# Altium footprint library mobinbyn-Socket.PcbLib: 131 footprints (part 2 of 9)
Each footprint in its own frame and in the unit in brackets; x right, y up, seen from the top. Pads: shape width x height; smd on the part's side, far side on the other; paste and mask are expansions set on the pad; w line width, h text height; cw(c..) or ccw(c..) is an arc to the next point about the centre after c.
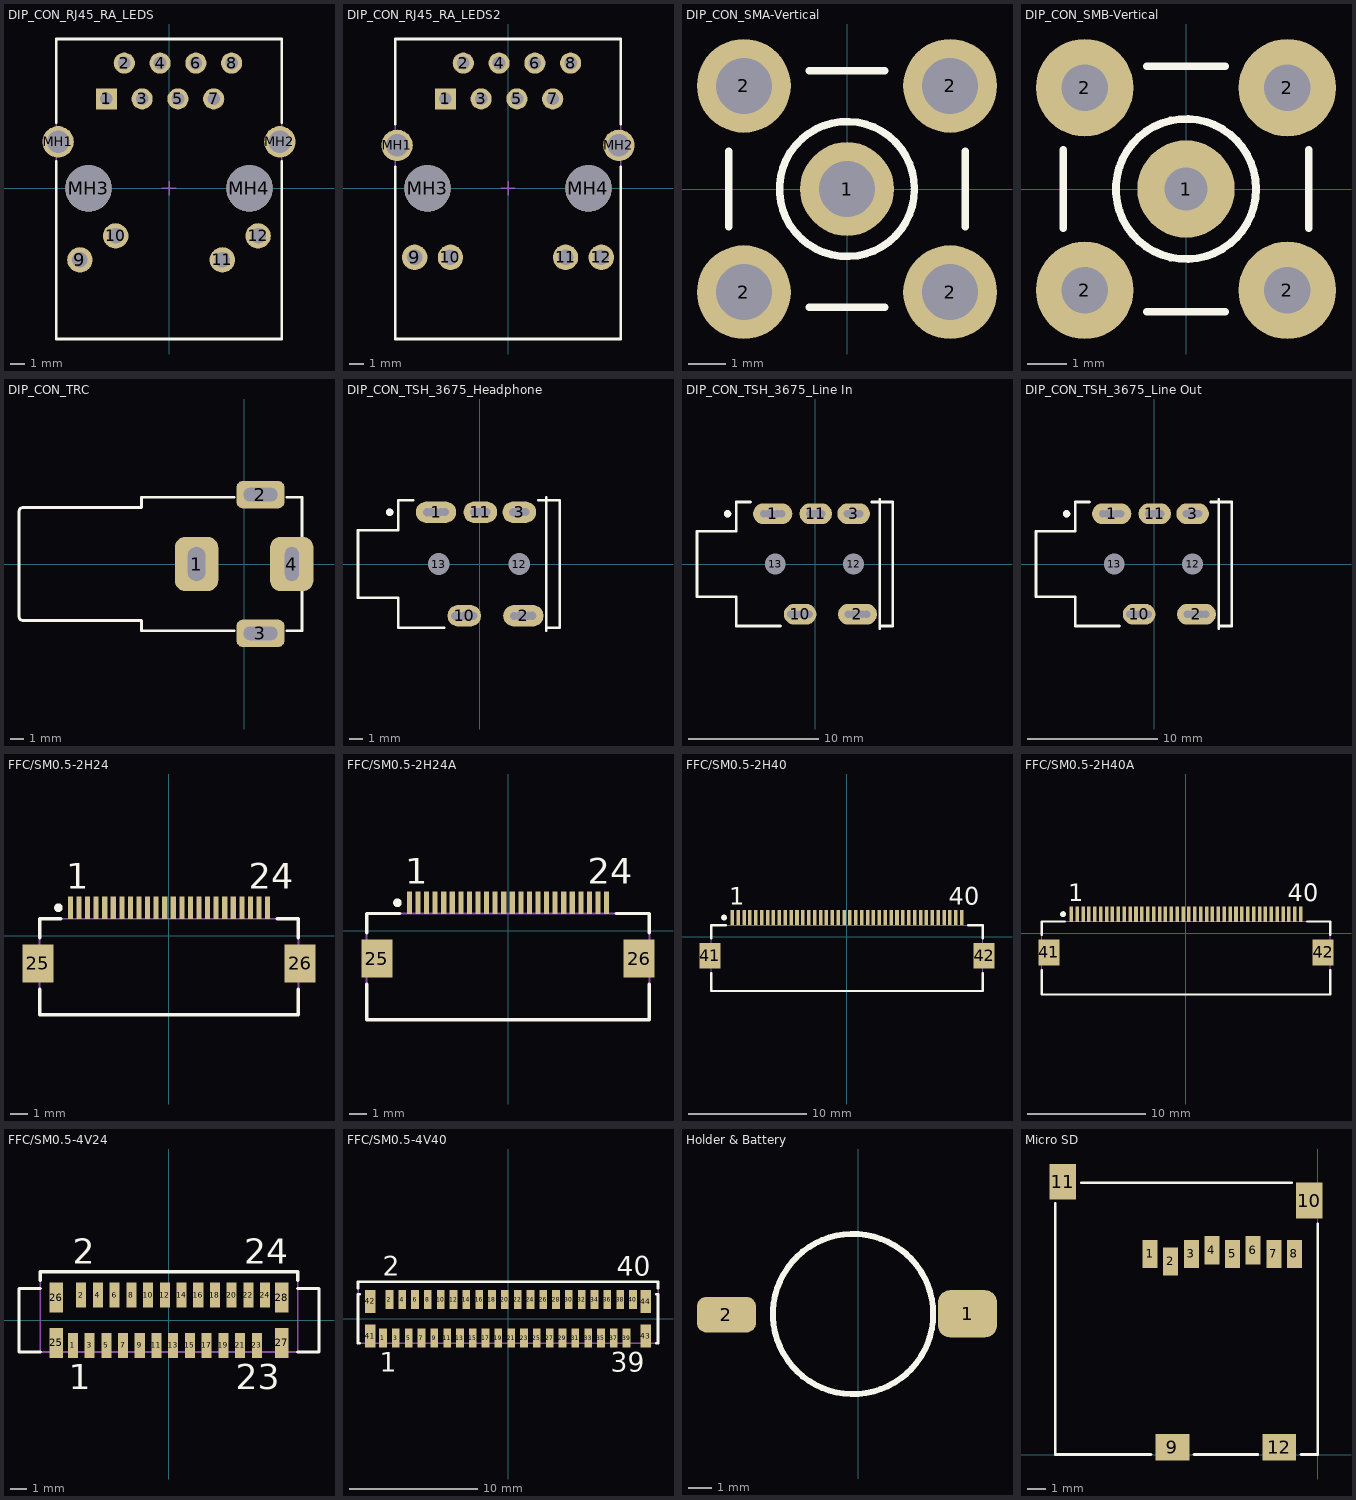
[diagram p1: the footprints below, top view; thin cyan lines are the x and y axes]

## DIP_CON_RJ45_RA_LEDS [mm] "RJ45 Ethernet Connector With LEDs"
height 13.2
pads (16):
  rect 1.5x1.5 hole 0.9: 1(-4.445,6.35)
  round 1.5 hole 0.9: 2(-3.175,8.89) 3(-1.905,6.35) 4(-0.635,8.89) 5(0.635,6.35) 6(1.905,8.89) 7(3.175,6.35) 8(4.445,8.89)
  round 1.8 hole 1.1: 9(-6.325,-5.08) 10(-3.785,-3.38) 11(3.785,-5.08) 12(6.325,-3.38)
  round 2.23 hole 1.6: MH1(-7.875,3.3) MH2(7.875,3.3)
  round 3.3 hole 3.3 unplated: MH3(-5.715,0) MH4(5.715,0)
Top Overlay:
  lines w0.2: -8,1.905 -8,-10.7 8,-10.7 8,1.905 ; -8,4.665 -8,10.6 8,10.6 8,4.665
Mechanical 13:
  lines w0.1: -8,-10.7 8,-10.7 8,10.6 -8,10.6 -8,-10.7
Mechanical 15:
  lines w0.1: -0.5,0 0.5,0 ; 0,-0.5 0,0.5
3D body "RJ45cat5step.stp": height 24.61, standoff -2.07, extent -6.043,-145.273 5.637,2.095
3D body "alteredRJstep.STEP": height 13.14, standoff -3.9, extent -7.897,-10.71 7.968,10.601

## DIP_CON_RJ45_RA_LEDS2 [mm] "HR911105A Connector"
height 13.2
pads (16):
  rect 1.5x1.5 hole 0.9: 1(-4.445,6.35)
  round 1.5 hole 0.9: 2(-3.175,8.89) 3(-1.905,6.35) 4(-0.635,8.89) 5(0.635,6.35) 6(1.905,8.89) 7(3.175,6.35) 8(4.445,8.89)
  round 1.8 hole 1.1: 9(-6.625,-4.9) 10(-4.085,-4.9) 11(4.085,-4.9) 12(6.625,-4.9)
  round 2.23 hole 1.6: MH1(-7.875,3.05) MH2(7.875,3.05)
  round 3.3 hole 3.3 unplated: MH3(-5.715,0) MH4(5.715,0)
Top Overlay:
  lines w0.2: -8,1.524 -8,-10.7 8,-10.7 8,1.524 ; -8,4.572 -8,10.6 8,10.6 8,4.572
Mechanical 13:
  lines w0.1: -8,-10.7 -8,10.6 8,10.6 8,-10.7 -8,-10.7
Mechanical 15:
  lines w0.1: -0.5,0 0.5,0 ; 0,-0.5 0,0.5
3D body "RJ45cat5step.stp": height 24.61, standoff -2.07, extent -6.043,-145.273 5.637,2.095
3D body "alteredRJstep.STEP": height 13.14, standoff -3.9, extent -7.897,-10.71 7.968,10.601

## DIP_CON_SMA-Vertical [mm] "High Frequency SMA Connector"
height 10
pads (5):
  round 2.5 hole 1.5: 1(0,0) 2(-2.75,-2.75) 2(-2.75,2.75) 2(2.75,-2.75) 2(2.75,2.75)
Top Overlay:
  circle w0.2: c0,0 r1.8
  lines w0.2: -3.15,-1 -3.15,1 ; -1,-3.15 1,-3.15 ; -1,3.15 1,3.15 ; 3.15,-1 3.15,1
Mechanical 1:
  circle w0.025: c0,0 r0.2
  circle w0.025: c0,0 r1.05
  circle w0.025: c0,0 r1.8
3D body "SMA.STEP": height 9.77, standoff -3.9, extent -3.25,-3.25 3.25,3.25

## DIP_CON_SMB-Vertical [mm] "High Frequency SMB Connector"
height 8
pads (5):
  round 2.5 hole 1.1: 1(0,0)
  round 2.5 hole 1.2: 2(-2.6,-2.6) 2(-2.6,2.6) 2(2.6,-2.6) 2(2.6,2.6)
Top Overlay:
  circle w0.2: c0,0 r1.8
  lines w0.2: -3.15,-1 -3.15,1 ; -1,-3.15 1,-3.15 ; -1,3.15 1,3.15 ; 3.15,-1 3.15,1
3D body "SMB.STEP": height 7.6, standoff -3, extent -2.985,-2.985 2.985,2.985

## DIP_CON_TRC [mm] "TRC Video Connector"
height 3
pads (4):
  rrect50% 3.2x4 hole 1.3 slot 2.5 at 90 deg: 1(-3.5,0)
  rrect50% 3.556x2.032 hole 1 slot 2.5 at 0 deg: 2(1.2,5.1) 3(1.2,-5.1)
  rrect50% 3.2x4 hole 1 slot 2.5 at 90 deg: 4(3.5,0)
Top Overlay:
  lines w0.2: -0.735,-4.9 -7.55,-4.9 -7.55,-4.15 -16.25,-4.15 cw(c-16.25,-3.85) -16.55,-3.85 -16.55,3.85 cw(c-16.25,3.85) -16.25,4.15 -7.55,4.15 -7.55,4.9 -0.735,4.9 ; 3.135,-4.9 4.25,-4.9 4.25,-1.69 ; 3.135,4.9 4.25,4.9 4.25,1.69
Mechanical 2:
  lines w1: 0.396,5.1 1.896,5.1 ; 0.45,-5.1 1.95,-5.1 ; 3.5,-0.75 3.5,0.75
  lines w1.3: -3.5,-0.6 -3.5,0.6
3D body: height 3, standoff 0, extent -3.561,2.452 -2.017,3.999
3D body "RCA plugcable.stp": height -2.91, standoff -14.11, extent -64.112,-5.639 -11.915,5.54
3D body "RCA Phono Jack.stp": height 13.58, standoff -4.84, extent -16.519,-5.263 3.983,5.519

## DIP_CON_TSH_3675_Headphone [mm] "TSH3675 Connector - Headphone"
height 7
pads (27):
  round 0.508 hole 0.6: 1(-3.935,3.848) 1(-3.617,3.848) 1(-2.882,3.852) 1(-2.565,3.852) 2(2.565,-3.852) 2(2.883,-3.852) 2(3.618,-3.848) 2(3.935,-3.848) 3(2.494,3.848) 3(2.735,3.848) 3(3.165,3.852) 3(3.406,3.852) 10(-1.835,-3.852) 10(-1.518,-3.852) 10(-0.783,-3.848) 10(-0.465,-3.848) 11(-0.406,3.848) 11(-0.165,3.848) 11(0.265,3.852) 11(0.506,3.852)
  oval 3x1.6 hole 0.6: 1(-3.25,3.85) 2(3.25,-3.85)
  oval 2.5x1.6 hole 0.6: 3(2.95,3.85) 10(-1.15,-3.85) 11(0.05,3.85)
  round 1.3 hole 1.6 unplated: 12(2.95,0) 13(-3.05,0)
Top Overlay:
  circle w0.3: c-6.7,3.85 r0.125
  lines w0.2: -4.95,4.75 -6.05,4.75 -6.05,2.5 -9.05,2.5 -9.05,-2.5 -6.05,-2.5 -6.05,-4.75 -2.65,-4.75 ; 4.35,4.75 5.95,4.75 5.95,-4.75 4.95,-4.75
  lines w0.203: 4.951,-4.95 4.951,4.95
Bottom Overlay:
  region: -4.686,2.468 -4.686,-4.54 -4.089,-4.54 -4.089,2.468
  region: -3.632,2.925 -3.632,2.747 -2.868,2.747 -2.868,2.925
  region: -0.332,2.925 -0.332,2.747 0.432,2.747 0.432,2.925
  region: 2.568,2.925 2.568,2.747 3.332,2.747 3.332,2.925
  region: -0.768,-2.925 -0.768,-2.747 -1.532,-2.747 -1.532,-2.925
  region: 3.632,-2.925 3.632,-2.747 2.868,-2.747 2.868,-2.925
  region: -6.981,2.596 -6.981,-2.611 -5.05,-2.611 -5.05,2.596
  region: 12.329,0.402 12.309,0.629 11.247,0.536 11.267,0.309
  region: 11.267,-0.41 11.247,-0.638 12.309,-0.731 12.329,-0.503
  lines w0.127: 9.836,-1.362 8.399,-1.362 ; 9.836,1.362 8.399,1.362 ; 8.399,-1.362 9.135,-1.093 9.133,-1.362 9.135,-1.631 8.399,-1.362 ; 8.399,1.362 9.135,1.631 9.133,1.362 9.135,1.093 8.399,1.362
  lines w0.152: 11.754,-0.72 ccw(c12.353,-0.042) 11.781,0.658
  lines w0.178: 8.794,-1.47 9.046,-1.47 ; 8.794,-1.254 9.046,-1.254 ; 8.794,1.254 9.046,1.254 ; 8.794,1.47 9.046,1.47
  lines w0.2: -5.05,-4.95 7.205,-4.95 7.205,4.95 -5.05,4.95 -5.05,-4.95
  lines w0.203: -4.342,1.425 -3.25,1.425 -3.25,2.816 ; -3.524,-1.012 -3.092,-1.012 -2.522,-2.149 -1.949,-1.012 2.267,-1.012 2.93,-1.012 3.226,-1.012 ; -2.305,0.944 -1.873,0.944 -1.303,2.081 -0.73,0.944 2.267,0.944 2.93,0.944 ; -1.499,-2.155 -1.181,-1.381 ; -1.181,-2.777 -1.181,-1.381 ; -0.864,-2.155 -1.181,-1.381 ; -0.279,2.087 0.038,1.312 ; 0.038,2.823 0.038,1.312 ; 0.356,2.087 0.038,1.312 ; 2.938,0.952 2.938,1.312 2.938,2.823 ; 3.238,-2.823 3.238,-1.312 3.238,-1.025 ; 11.418,-0.542 ccw(c11.818,-0.229) 12.144,-0.618 ; 11.418,0.44 cw(c11.818,0.127) 12.144,0.517
  text "L" at 3.659,-2.239 h0.86
  text "R" at 3.659,1.774 h0.86
  text "HEADPHONES" at 5.586,-4.318 h1.4
Mechanical 7:
  circle w0.3: c-6.7,3.85 r0.125
  lines w0.1: -4.95,4.75 -6.05,4.75 -6.05,2.5 -9.05,2.5 -9.05,-2.5 -6.05,-2.5 -6.05,-4.75 -2.65,-4.75 ; 4.35,4.75 5.95,4.75 5.95,-4.75 4.95,-4.75
3D body: height 0, standoff -2, extent 2.818,3.33 3.122,4.394
3D body: height 0, standoff -2, extent -0.093,3.308 0.211,4.373
3D body: height 0, standoff -2, extent -1.32,-4.425 -1.016,-3.361
3D body: height 0, standoff -2, extent -3.354,3.205 -3.049,4.496
3D body: height 0, standoff -2, extent 3.126,-4.471 3.431,-3.18
3D body "PCB1.step": height 7.79, standoff -3.56, extent -112.561,-4.506 1.776,4.506
3D body "stereojackblack3-5.STEP": height 5, standoff 0, extent -9.025,-4.725 5.975,4.775

## DIP_CON_TSH_3675_Line In [mm] "TSH3675 Connector - Line In"
height 7
pads (27):
  round 0.508 hole 0.6: 1(-3.935,3.848) 1(-3.617,3.848) 1(-2.882,3.852) 1(-2.565,3.852) 2(2.565,-3.852) 2(2.883,-3.852) 2(3.618,-3.848) 2(3.935,-3.848) 3(2.494,3.848) 3(2.735,3.848) 3(3.165,3.852) 3(3.406,3.852) 10(-1.835,-3.852) 10(-1.518,-3.852) 10(-0.783,-3.848) 10(-0.465,-3.848) 11(-0.406,3.848) 11(-0.165,3.848) 11(0.265,3.852) 11(0.506,3.852)
  oval 3x1.6 hole 0.6: 1(-3.25,3.85) 2(3.25,-3.85)
  oval 2.5x1.6 hole 0.6: 3(2.95,3.85) 10(-1.15,-3.85) 11(0.05,3.85)
  round 1.3 hole 1.6 unplated: 12(2.95,0) 13(-3.05,0)
Top Overlay:
  circle w0.3: c-6.7,3.85 r0.125
  lines w0.2: -4.95,4.75 -6.05,4.75 -6.05,2.5 -9.05,2.5 -9.05,-2.5 -6.05,-2.5 -6.05,-4.75 -2.65,-4.75 ; 4.35,4.75 5.95,4.75 5.95,-4.75 4.95,-4.75
  lines w0.203: 4.951,-4.95 4.951,4.95
Bottom Overlay:
  region: -6.981,2.596 -6.981,-2.611 -5.05,-2.611 -5.05,2.596
  region: 3.632,-2.925 3.632,-2.747 2.868,-2.747 2.868,-2.925
  region: -0.768,-2.925 -0.768,-2.747 -1.532,-2.747 -1.532,-2.925
  region: 2.568,2.925 2.568,2.747 3.332,2.747 3.332,2.925
  region: -0.332,2.925 -0.332,2.747 0.432,2.747 0.432,2.925
  region: -3.632,2.925 -3.632,2.747 -2.868,2.747 -2.868,2.925
  region: -4.686,2.468 -4.686,-4.54 -4.089,-4.54 -4.089,2.468
  lines w0.127: 8.555,-1.362 9.992,-1.362 ; 8.555,1.362 9.992,1.362 ; 9.992,-1.362 9.256,-1.631 9.258,-1.362 9.256,-1.093 9.992,-1.362 ; 9.992,1.362 9.256,1.093 9.258,1.362 9.256,1.631 9.992,1.362
  lines w0.152: 11.49,0.754 cw(c12.369,-0.55) 13.179,0.798 ; 12.055,0.363 cw(c12.344,-0.525) 12.694,0.341
  lines w0.178: 9.346,-1.47 9.597,-1.47 ; 9.346,-1.254 9.597,-1.254 ; 9.346,1.254 9.597,1.254 ; 9.346,1.47 9.597,1.47
  lines w0.2: -5.05,-4.95 -5.05,4.95 7.205,4.95 7.205,-4.95 -5.05,-4.95
  lines w0.203: -4.342,1.425 -3.25,1.425 -3.25,2.816 ; -3.524,-1.012 -3.092,-1.012 -2.522,-2.149 -1.949,-1.012 2.267,-1.012 2.93,-1.012 3.226,-1.012 ; -2.305,0.944 -1.873,0.944 -1.303,2.081 -0.73,0.944 2.267,0.944 2.93,0.944 ; -1.499,-2.155 -1.181,-1.381 ; -1.181,-2.777 -1.181,-1.381 ; -0.864,-2.155 -1.181,-1.381 ; -0.279,2.087 0.038,1.312 ; 0.038,2.823 0.038,1.312 ; 0.356,2.087 0.038,1.312 ; 2.938,0.952 2.938,1.312 2.938,2.823 ; 3.238,-2.823 3.238,-1.312 3.238,-1.025 ; 11.937,-0.296 12.801,-0.296 ; 12.064,-0.652 11.455,-0.042 13.309,-0.042 12.699,-0.652 12.039,-0.652 12.039,-1.16 12.699,-1.16 12.699,-0.703 ; 12.217,-1.109 12.217,-0.55 ; 12.395,-1.109 12.395,-0.652 ; 12.547,-1.109 12.547,-0.703 ; 12.877,-0.245 12.649,-0.474 12.09,-0.474 11.76,-0.144 13.03,-0.144
  text "R" at 3.659,1.774 h0.86
  text "L" at 3.659,-2.239 h0.86
  text "LINE IN" at 4.976,-4.95 h1.52
Mechanical 7:
  circle w0.3: c-6.7,3.85 r0.125
  lines w0.1: -4.95,4.75 -6.05,4.75 -6.05,2.5 -9.05,2.5 -9.05,-2.5 -6.05,-2.5 -6.05,-4.75 -2.65,-4.75 ; 4.35,4.75 5.95,4.75 5.95,-4.75 4.95,-4.75
3D body "stereojackblack3-5.STEP": height 5, standoff 0, extent -9.025,-4.725 5.975,4.775
3D body "PCB1.step": height 7.79, standoff -3.56, extent -112.561,-4.506 1.776,4.506
3D body: height 0, standoff -2, extent 3.126,-4.471 3.431,-3.18
3D body: height 0, standoff -2, extent -3.354,3.205 -3.049,4.496
3D body: height 0, standoff -2, extent -1.32,-4.425 -1.016,-3.361
3D body: height 0, standoff -2, extent -0.093,3.308 0.211,4.373
3D body: height 0, standoff -2, extent 2.818,3.33 3.122,4.394

## DIP_CON_TSH_3675_Line Out [mm] "TSH3675 Connector - Line Out"
height 7
pads (27):
  round 0.508 hole 0.6: 1(-3.935,3.848) 1(-3.617,3.848) 1(-2.882,3.852) 1(-2.565,3.852) 2(2.565,-3.852) 2(2.883,-3.852) 2(3.618,-3.848) 2(3.935,-3.848) 3(2.494,3.848) 3(2.735,3.848) 3(3.165,3.852) 3(3.406,3.852) 10(-1.835,-3.852) 10(-1.518,-3.852) 10(-0.783,-3.848) 10(-0.465,-3.848) 11(-0.406,3.848) 11(-0.165,3.848) 11(0.265,3.852) 11(0.506,3.852)
  oval 3x1.6 hole 0.6: 1(-3.25,3.85) 2(3.25,-3.85)
  oval 2.5x1.6 hole 0.6: 3(2.95,3.85) 10(-1.15,-3.85) 11(0.05,3.85)
  round 1.3 hole 1.6 unplated: 12(2.95,0) 13(-3.05,0)
Top Overlay:
  circle w0.3: c-6.7,3.85 r0.125
  lines w0.2: -4.95,4.75 -6.05,4.75 -6.05,2.5 -9.05,2.5 -9.05,-2.5 -6.05,-2.5 -6.05,-4.75 -2.65,-4.75 ; 4.35,4.75 5.95,4.75 5.95,-4.75 4.95,-4.75
  lines w0.203: 4.951,-4.95 4.951,4.95
Bottom Overlay:
  region: -6.981,2.596 -6.981,-2.611 -5.05,-2.611 -5.05,2.596
  region: 3.632,-2.925 3.632,-2.747 2.868,-2.747 2.868,-2.925
  region: -0.768,-2.925 -0.768,-2.747 -1.532,-2.747 -1.532,-2.925
  region: 2.568,2.925 2.568,2.747 3.332,2.747 3.332,2.925
  region: -0.332,2.925 -0.332,2.747 0.432,2.747 0.432,2.925
  region: -3.632,2.925 -3.632,2.747 -2.868,2.747 -2.868,2.925
  region: -4.686,2.468 -4.686,-4.54 -4.089,-4.54 -4.089,2.468
  lines w0.127: 9.836,-1.362 8.399,-1.362 ; 9.836,1.362 8.399,1.362 ; 8.399,-1.362 9.135,-1.093 9.133,-1.362 9.135,-1.631 8.399,-1.362 ; 8.399,1.362 9.135,1.631 9.133,1.362 9.135,1.093 8.399,1.362
  lines w0.152: 11.49,0.754 cw(c12.369,-0.55) 13.179,0.798 ; 12.055,0.363 cw(c12.344,-0.525) 12.694,0.341
  lines w0.178: 8.794,-1.47 9.046,-1.47 ; 8.794,-1.254 9.046,-1.254 ; 8.794,1.254 9.046,1.254 ; 8.794,1.47 9.046,1.47
  lines w0.2: -5.05,-4.95 -5.05,4.95 7.205,4.95 7.205,-4.95 -5.05,-4.95
  lines w0.203: -4.342,1.425 -3.25,1.425 -3.25,2.816 ; -3.524,-1.012 -3.092,-1.012 -2.522,-2.149 -1.949,-1.012 2.267,-1.012 2.93,-1.012 3.226,-1.012 ; -2.305,0.944 -1.873,0.944 -1.303,2.081 -0.73,0.944 2.267,0.944 2.93,0.944 ; -1.499,-2.155 -1.181,-1.381 ; -1.181,-2.777 -1.181,-1.381 ; -0.864,-2.155 -1.181,-1.381 ; -0.279,2.087 0.038,1.312 ; 0.038,2.823 0.038,1.312 ; 0.356,2.087 0.038,1.312 ; 2.938,0.952 2.938,1.312 2.938,2.823 ; 3.238,-2.823 3.238,-1.312 3.238,-1.025 ; 11.937,-0.296 12.801,-0.296 ; 12.064,-0.652 11.455,-0.042 13.309,-0.042 12.699,-0.652 12.039,-0.652 12.039,-1.16 12.699,-1.16 12.699,-0.703 ; 12.217,-1.109 12.217,-0.55 ; 12.395,-1.109 12.395,-0.652 ; 12.547,-1.109 12.547,-0.703 ; 12.877,-0.245 12.649,-0.474 12.09,-0.474 11.76,-0.144 13.03,-0.144
  text "LINE OUT" at 4.976,-4.95 h1.52
  text "R" at 3.659,1.774 h0.86
  text "L" at 3.659,-2.239 h0.86
Mechanical 7:
  circle w0.3: c-6.7,3.85 r0.125
  lines w0.1: -4.95,4.75 -6.05,4.75 -6.05,2.5 -9.05,2.5 -9.05,-2.5 -6.05,-2.5 -6.05,-4.75 -2.65,-4.75 ; 4.35,4.75 5.95,4.75 5.95,-4.75 4.95,-4.75
3D body "stereojackblack3-5.STEP": height 5, standoff 0, extent -9.025,-4.725 5.975,4.775
3D body "PCB1.step": height 7.79, standoff -3.56, extent -112.561,-4.506 1.776,4.506
3D body: height 0, standoff -2, extent 3.126,-4.471 3.431,-3.18
3D body: height 0, standoff -2, extent -3.354,3.205 -3.049,4.496
3D body: height 0, standoff -2, extent -1.32,-4.425 -1.016,-3.361
3D body: height 0, standoff -2, extent -0.093,3.308 0.211,4.373
3D body: height 0, standoff -2, extent 2.818,3.33 3.122,4.394

## FFC/SM0.5-2H24 [mm] "Connector; FH12 Series; 24 Position; 0.5mm Spaced Bottom Contact"
height 2
pads (26):
  rect 0.3x1.3 smd: 1(-5.75,1.625) 2(-5.25,1.625) 3(-4.75,1.625) 4(-4.25,1.625) 5(-3.75,1.625) 6(-3.25,1.625) 7(-2.75,1.625) 8(-2.25,1.625) 9(-1.75,1.625) 10(-1.25,1.625) 11(-0.75,1.625) 12(-0.25,1.625) 13(0.25,1.625) 14(0.75,1.625) 15(1.25,1.625) 16(1.75,1.625) 17(2.25,1.625) 18(2.75,1.625) 19(3.25,1.625) 20(3.75,1.625) 21(4.25,1.625) 22(4.75,1.625) 23(5.25,1.625) 24(5.75,1.625)
  rect 1.8x2.2 smd: 25(-7.65,-1.625) 26(7.65,-1.625)
Top Overlay:
  circle w0.25: c-6.45,1.625 r0.125
  lines w0.2: -7.55,-3.125 -7.55,-4.625 7.55,-4.625 7.55,-3.125 ; -7.55,-0.125 -7.55,0.975 -6.3,0.975 ; 6.3,0.975 7.55,0.975 7.55,-0.125
  text "24" at 4.65,2.725 h1.5
  text "1" at -6,2.725 h1.5
Mechanical 13:
  lines w0.1: -7.55,-4.625 -7.55,0.975 7.55,0.975 7.55,-4.625 -7.55,-4.625
3D body "5604.stp": height 2, standoff -0.04, extent -9.3,-4.83 9.3,1.97

## FFC/SM0.5-2H24A [mm] "Connector; FH12 Series; 24 Position; 0.5mm Spaced Top Contact"
height 2
pads (26):
  rect 0.3x1.3 smd: 1(-5.75,1.625) 2(-5.25,1.625) 3(-4.75,1.625) 4(-4.25,1.625) 5(-3.75,1.625) 6(-3.25,1.625) 7(-2.75,1.625) 8(-2.25,1.625) 9(-1.75,1.625) 10(-1.25,1.625) 11(-0.75,1.625) 12(-0.25,1.625) 13(0.25,1.625) 14(0.75,1.625) 15(1.25,1.625) 16(1.75,1.625) 17(2.25,1.625) 18(2.75,1.625) 19(3.25,1.625) 20(3.75,1.625) 21(4.25,1.625) 22(4.75,1.625) 23(5.25,1.625) 24(5.75,1.625)
  rect 1.8x2.2 smd: 25(-7.65,-1.625) 26(7.65,-1.625)
Top Overlay:
  circle w0.25: c-6.45,1.625 r0.125
  lines w0.2: -8.25,-3.125 -8.25,-5.2 8.25,-5.2 8.25,-3.125 ; -8.25,-0.125 -8.25,1 -6.3,1 ; 6.3,1 8.25,1 8.25,-0.125
  text "24" at 4.65,2.725 h1.5
  text "1" at -6,2.725 h1.5
Mechanical 13:
  lines w0.1: -8.25,-5.2 -8.25,1 8.25,1 8.25,-5.2 -8.25,-5.2
3D body "5604.stp": height 2, standoff -0.04, extent -9.3,-4.83 9.3,1.97

## FFC/SM0.5-2H40 [mm] "Connector; FH12 Series; 40 Position; 0.5mm Spaced Bottom Contact"
height 2
pads (42):
  rect 0.3x1.3 smd: 1(-9.75,1.625) 2(-9.25,1.625) 3(-8.75,1.625) 4(-8.25,1.625) 5(-7.75,1.625) 6(-7.25,1.625) 7(-6.75,1.625) 8(-6.25,1.625) 9(-5.75,1.625) 10(-5.25,1.625) 11(-4.75,1.625) 12(-4.25,1.625) 13(-3.75,1.625) 14(-3.25,1.625) 15(-2.75,1.625) 16(-2.25,1.625) 17(-1.75,1.625) 18(-1.25,1.625) 19(-0.75,1.625) 20(-0.25,1.625) 21(0.25,1.625) 22(0.75,1.625) 23(1.25,1.625) 24(1.75,1.625) 25(2.25,1.625) 26(2.75,1.625) 27(3.25,1.625) 28(3.75,1.625) 29(4.25,1.625) 30(4.75,1.625) 31(5.25,1.625) 32(5.75,1.625) 33(6.25,1.625) 34(6.75,1.625) 35(7.25,1.625) 36(7.75,1.625) 37(8.25,1.625) 38(8.75,1.625) 39(9.25,1.625) 40(9.75,1.625)
  rect 1.8x2.2 smd: 41(-11.65,-1.625) 42(11.65,-1.625)
Top Overlay:
  circle w0.25: c-10.45,1.625 r0.125
  lines w0.2: -11.55,-3.125 -11.55,-4.625 11.55,-4.625 11.55,-3.125 ; -11.55,-0.125 -11.55,0.975 -10.3,0.975 ; 10.3,0.975 11.55,0.975 11.55,-0.125
  text "1" at -10,2.725 h1.5
  text "40" at 8.65,2.725 h1.5
Mechanical 13:
  lines w0.1: -11.55,-4.625 -11.55,0.975 11.55,0.975 11.55,-4.625 -11.55,-4.625
3D body "ffc_fpc_affc25-40-050-shb-t.STEP": height 2.2, standoff -0.05, extent -12.05,-4.854 12.05,1.645

## FFC/SM0.5-2H40A [mm] "Connector; FH12 Series; 40 Position; 0.5mm Spaced Top Contact"
height 2
pads (42):
  rect 0.3x1.3 smd: 1(-9.75,1.625) 2(-9.25,1.625) 3(-8.75,1.625) 4(-8.25,1.625) 5(-7.75,1.625) 6(-7.25,1.625) 7(-6.75,1.625) 8(-6.25,1.625) 9(-5.75,1.625) 10(-5.25,1.625) 11(-4.75,1.625) 12(-4.25,1.625) 13(-3.75,1.625) 14(-3.25,1.625) 15(-2.75,1.625) 16(-2.25,1.625) 17(-1.75,1.625) 18(-1.25,1.625) 19(-0.75,1.625) 20(-0.25,1.625) 21(0.25,1.625) 22(0.75,1.625) 23(1.25,1.625) 24(1.75,1.625) 25(2.25,1.625) 26(2.75,1.625) 27(3.25,1.625) 28(3.75,1.625) 29(4.25,1.625) 30(4.75,1.625) 31(5.25,1.625) 32(5.75,1.625) 33(6.25,1.625) 34(6.75,1.625) 35(7.25,1.625) 36(7.75,1.625) 37(8.25,1.625) 38(8.75,1.625) 39(9.25,1.625) 40(9.75,1.625)
  rect 1.8x2.2 smd: 41(-11.65,-1.625) 42(11.65,-1.625)
Top Overlay:
  circle w0.25: c-10.45,1.625 r0.125
  lines w0.2: -12.25,-3.125 -12.25,-5.2 12.25,-5.2 12.25,-3.125 ; -12.25,-0.125 -12.25,1 -10.3,1 ; 10.3,1 12.25,1 12.25,-0.125
  text "40" at 8.65,2.725 h1.5
  text "1" at -10,2.725 h1.5
Mechanical 13:
  lines w0.1: -12.25,-5.2 -12.25,1 12.25,1 12.25,-5.2 -12.25,-5.2
3D body "ffc_fpc_affc25-40-050-shb-t.STEP": height 2.2, standoff -0.05, extent -12.05,-4.854 12.05,1.645

## FFC/SM0.5-4V24 [mm] "Connector; FH12 Series; 24 Position; 0.5mm Spaced Vertical Mounting"
height 4.85
pads (28):
  rect 0.6x1.5 smd: 1(-5.75,-1.5) 2(-5.25,1.5) 3(-4.75,-1.5) 4(-4.25,1.5) 5(-3.75,-1.5) 6(-3.25,1.5) 7(-2.75,-1.5) 8(-2.25,1.5) 9(-1.75,-1.5) 10(-1.25,1.5) 11(-0.75,-1.5) 12(-0.25,1.5) 13(0.25,-1.5) 14(0.75,1.5) 15(1.25,-1.5) 16(1.75,1.5) 17(2.25,-1.5) 18(2.75,1.5) 19(3.25,-1.5) 20(3.75,1.5) 21(4.25,-1.5) 22(4.75,1.5) 23(5.25,-1.5) 24(5.75,1.5)
  rect 0.8x1.8 smd: 25(-6.75,-1.35) 26(-6.75,1.35) 27(6.75,-1.35) 28(6.75,1.35)
Top Overlay:
  lines w0.2: -7.7,-1.9 -8.97,-1.9 -8.97,1.9 -7.7,1.9 ; -7.7,2.4 -7.7,2.9 7.7,2.9 7.7,2.4 ; 7.7,-1.9 8.97,-1.9 8.97,1.9 7.7,1.9
  text "23" at 4,-4.125 h1.5
  text "24" at 4.5,3.375 h1.5
  text "2" at -5.75,3.375 h1.5
  text "1" at -6,-4.125 h1.5
Mechanical 13:
  lines w0.1: -7.7,-1.9 -7.7,2.9 7.7,2.9 7.7,-1.9 -7.7,-1.9
3D body "5632.stp": height 3.9, standoff 0, extent -8.85,-1.65 8.85,1.85

## FFC/SM0.5-4V40 [mm] "Connector; FH12 Series; 40 Position; 0.5mm Spaced Vertical Mounting"
height 4.85
pads (44):
  rect 0.6x1.5 smd: 1(-9.75,-1.5) 2(-9.25,1.5) 3(-8.75,-1.5) 4(-8.25,1.5) 5(-7.75,-1.5) 6(-7.25,1.5) 7(-6.75,-1.5) 8(-6.25,1.5) 9(-5.75,-1.5) 10(-5.25,1.5) 11(-4.75,-1.5) 12(-4.25,1.5) 13(-3.75,-1.5) 14(-3.25,1.5) 15(-2.75,-1.5) 16(-2.25,1.5) 17(-1.75,-1.5) 18(-1.25,1.5) 19(-0.75,-1.5) 20(-0.25,1.5) 21(0.25,-1.5) 22(0.75,1.5) 23(1.25,-1.5) 24(1.75,1.5) 25(2.25,-1.5) 26(2.75,1.5) 27(3.25,-1.5) 28(3.75,1.5) 29(4.25,-1.5) 30(4.75,1.5) 31(5.25,-1.5) 32(5.75,1.5) 33(6.25,-1.5) 34(6.75,1.5) 35(7.25,-1.5) 36(7.75,1.5) 37(8.25,-1.5) 38(8.75,1.5) 39(9.25,-1.5) 40(9.75,1.5)
  rect 0.8x1.8 smd: 41(-10.75,-1.35) 42(-10.75,1.35) 43(10.75,-1.35) 44(10.75,1.35)
Top Overlay:
  lines w0.2: -11.7,2.4 -11.7,2.9 11.7,2.9 11.7,2.4 ; -11.55,-1.9 -11.7,-1.9 -11.7,1.9 -11.55,1.9 ; 11.55,-1.9 11.7,-1.9 11.7,1.9 11.55,1.9
  text "1" at -10,-4.125 h1.5
  text "2" at -9.75,3.375 h1.5
  text "40" at 8.5,3.375 h1.5
  text "39" at 8,-4.125 h1.5
Mechanical 13:
  lines w0.1: -11.7,-1.9 11.7,-1.9 11.7,2.9 -11.7,2.9 -11.7,-1.9
3D body "ZIF connector.stp": height 4.47, standoff -0.02, extent -12.118,-1.454 12.182,1.483

## Holder & Battery [mm] "Holder Battery 3.3v"
pads (2):
  rrect50% 2.5x2 smd: 1(4.63,10.69)
  rrect50% 2.5x1.5 smd: 2(-5.6,10.65)
Top Overlay:
  circle w0.254: c-0.228,10.68 r3.4
3D body "battery_capacitor.STEP": height 2.07, standoff -0.01, extent -6.12,7.3 5.45,14.1

## Micro SD [mm] "MicroSD Socket (Molex 500873-080X)"
height 1.88
pads (12):
  rect 0.8x1.5 smd: 1(-8.94,10.7) 2(-7.84,10.3) 3(-6.74,10.7) 4(-5.64,10.9) 5(-4.54,10.7) 6(-3.44,10.9) 7(-2.34,10.7) 8(-1.24,10.7)
  rect 1.8x1.4 smd: 9(-7.75,0.4) 12(-2.05,0.4)
  rect 1.4x1.9 smd: 10(-0.45,13.55) 11(-13.6,14.55)
Top Overlay:
  lines w0.152: -14,13.4 -14,0 -8.9,0 ; -12.6,14.5 -1.4,14.5 ; -6.6,0 -3.2,0 ; -0.9,0 0,0 0,12.3
3D body "5008730806.stp": height 1.85, standoff -0.05, extent -14,-0.1 0,15.101